# Altium footprint library RES_TH.PcbLib: 104 footprints (part 1 of 7)
Each footprint in its own frame and in the unit in brackets; x right, y up, seen from the top. Pads: shape width x height; smd on the part's side, far side on the other; paste and mask are expansions set on the pad; w line width, h text height; cw(c..) or ccw(c..) is an arc to the next point about the centre after c.
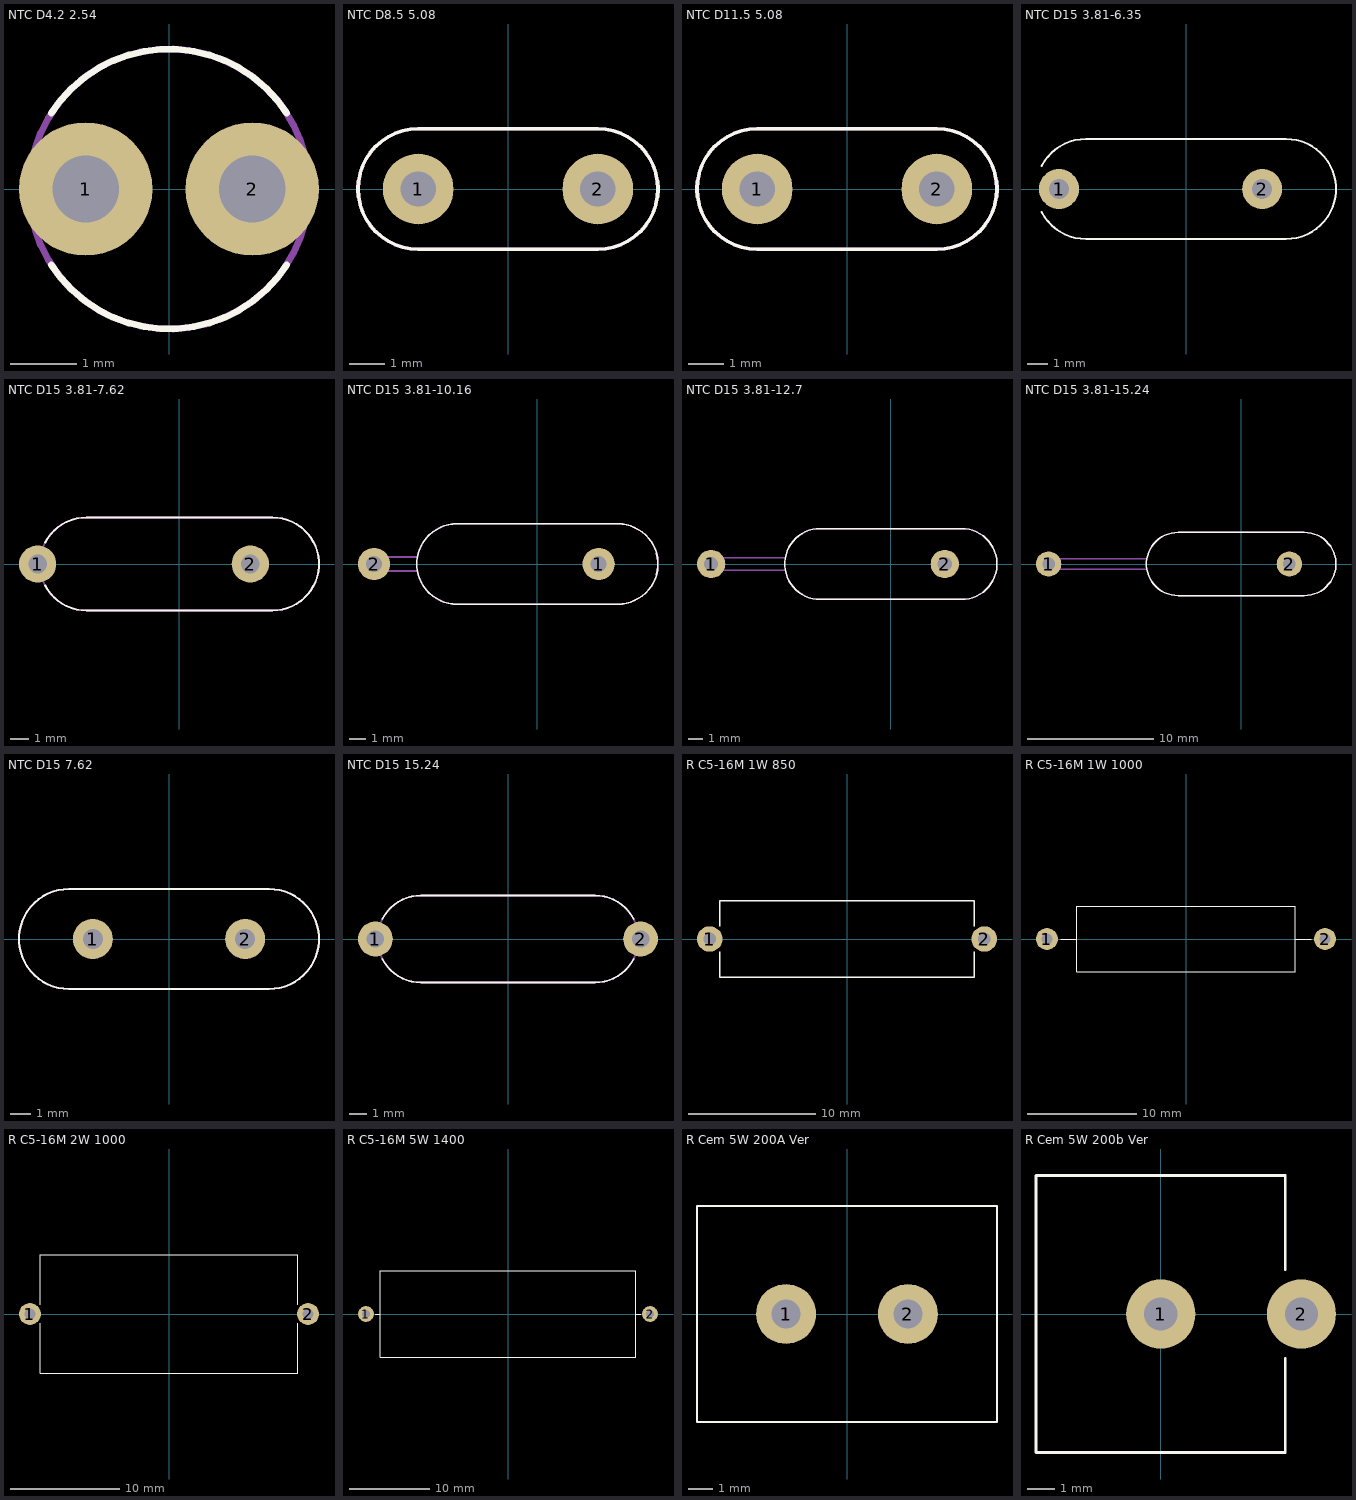
[diagram p0: the footprints below, top view; thin cyan lines are the x and y axes]

## NTC D4.2 2.54 [mm]
pads (2):
  round 2 hole 1: 1(-1.25,0) 2(1.25,0)
Top Overlay:
  lines w0.1: -1.767,-1.136 ccw(c0,0) 1.766,-1.136 ; -1.766,1.136 cw(c0,0) 1.767,1.136
Top Courtyard:
  circle w0.1: c0,0 r2.1
3D body "NTC 2.STEP": height 7.99, standoff -3, extent -2.1,-2 2.096,2

## NTC D8.5 5.08 [mm]
pads (2):
  round 2 hole 1: 1(-2.54,0) 2(2.54,0)
Top Overlay:
  lines w0.1: -2.54,-1.7 cw(c-2.54,0) -2.54,1.7 2.54,1.7 cw(c2.54,0) 2.54,-1.7 -2.54,-1.7
Top Courtyard:
  lines w0.1: -2.54,-1.7 cw(c-2.54,0) -2.54,1.7 2.54,1.7 cw(c2.54,0) 2.54,-1.7 -2.54,-1.7
3D body "NTC B57153 d8.5 5mm.STEP": height 14.25, standoff 0, extent -4.25,-1.679 4.25,1.68

## NTC D11.5 5.08 [mm]
pads (2):
  round 2 hole 1: 1(-2.54,0) 2(2.54,0)
Top Overlay:
  lines w0.1: -2.54,-1.7 cw(c-2.54,0) -2.54,1.7 2.54,1.7 cw(c2.54,0) 2.54,-1.7 -2.54,-1.7
Top Courtyard:
  lines w0.1: -2.54,-1.7 cw(c-2.54,0) -2.54,1.7 ; -2.54,-1.7 cw(c-2.54,0) -2.54,1.7 ; -2.54,-1.7 2.54,-1.7 ; -2.54,-1.7 2.54,-1.7 ; -2.54,1.7 2.54,1.7 ; -2.54,1.7 2.54,1.7 ; 2.54,-1.7 ccw(c2.54,0) 2.54,1.7 ; 2.54,-1.7 ccw(c2.54,0) 2.54,1.7
3D body "NTC B57153 d8.5 5mm.STEP": height 14.25, standoff 0, extent -4.25,-1.679 4.25,1.68

## NTC D15 3.81-6.35 [mm]
pads (2):
  round 2 hole 1: 1(-6.35,0) 2(3.81,0)
Top Overlay:
  lines w0.1: -7.224,-1.141 ccw(c-5,0) -5,-2.5 ; -7.224,1.141 cw(c-5,0) -5,2.5 5,2.5 cw(c5,0) 5,-2.5 -5,-2.5
3D body "NTC-B57237 3.81-6.STEP": height 22.5, standoff -2.5, extent -7.5,-2.5 7.5,2.5

## NTC D15 3.81-7.62 [mm]
pads (2):
  round 2 hole 1: 1(-7.62,0) 2(3.81,0)
Top Overlay:
  lines w0.1: -7.224,-1.141 ccw(c-5,0) -5,-2.5 ; -7.224,1.141 cw(c-5,0) -5,2.5 5,2.5 cw(c5,0) 5,-2.5 -5,-2.5
Top Courtyard:
  lines w0.1: -5,-2.5 cw(c-5,0) -5,2.5 5,2.5 cw(c5,0) 5,-2.5 -5,-2.5
3D body "NTC-B57237 3.81-7.STEP": height 22.5, standoff -2.5, extent -8.02,-2.5 7.5,2.5

## NTC D15 3.81-10.16 [mm]
pads (2):
  round 2 hole 1: 1(3.81,0) 2(-10.16,0)
Top Overlay:
  lines w0.1: -5,-2.5 cw(c-5,0) -5,2.5 5,2.5 cw(c5,0) 5,-2.5 -5,-2.5
Top Courtyard:
  lines w0.1: -10.125,-0.434 -10.125,0.434 -7.462,0.434 cw(c-5,0) -5,2.5 5,2.5 cw(c5,0) 5,-2.5 -5,-2.5 cw(c-5,0) -7.462,-0.434 -10.125,-0.434
3D body "NTC-B57237 3.81-10.STEP": height 22.5, standoff -2.5, extent -10.56,-2.5 7.5,2.5

## NTC D15 3.81-12.7 [mm]
pads (2):
  round 2 hole 1: 1(-12.7,0) 2(3.81,0)
Top Overlay:
  lines w0.1: -5,-2.5 cw(c-5,0) -5,2.5 5,2.5 cw(c5,0) 5,-2.5 -5,-2.5
Top Courtyard:
  lines w0.1: -12.625,-0.434 -12.625,0.434 -7.462,0.434 cw(c-5,0) -5,2.5 5,2.5 cw(c5,0) 5,-2.5 -5,-2.5 cw(c-5,0) -7.462,-0.434 -12.625,-0.434
3D body "NTC-B57237 3.81-12.STEP": height 22.5, standoff -2.5, extent -13.1,-2.5 7.5,2.5

## NTC D15 3.81-15.24 [mm]
pads (2):
  round 2 hole 1: 1(-15.24,0) 2(3.81,0)
Top Overlay:
  lines w0.1: -5,-2.5 cw(c-5,0) -5,2.5 5,2.5 cw(c5,0) 5,-2.5 -5,-2.5
Top Courtyard:
  lines w0.1: -15.25,-0.434 -15.25,0.434 -7.462,0.434 cw(c-5,0) -5,2.5 5,2.5 cw(c5,0) 5,-2.5 -5,-2.5 cw(c-5,0) -7.462,-0.434 -15.25,-0.434
3D body "NTC-B57237 3.81-15.STEP": height 22.5, standoff -2.5, extent -15.64,-2.5 7.5,2.5

## NTC D15 7.62 [mm]
pads (2):
  round 2 hole 1: 1(-3.81,0) 2(3.81,0)
Top Overlay:
  lines w0.1: -5,-2.5 cw(c-5,0) -5,2.5 5,2.5 cw(c5,0) 5,-2.5 -5,-2.5
Top Courtyard:
  lines w0.1: -5,-2.5 cw(c-5,0) -5,2.5 5,2.5 cw(c5,0) 5,-2.5 -5,-2.5
3D body "NTC-B57237 7.STEP": height 22.5, standoff -2.5, extent -7.5,-2.5 7.5,2.5

## NTC D15 15.24 [mm]
pads (2):
  round 2 hole 1: 1(-7.62,0) 2(7.62,0)
Top Overlay:
  lines w0.1: -7.224,-1.141 ccw(c-5,0) -5,-2.5 5,-2.5 ; -7.224,1.141 cw(c-5,0) -5,2.5 5,2.5 cw(c5,0) 7.224,1.141 ; 5,-2.5 ccw(c5,0) 7.224,-1.141
Top Courtyard:
  lines w0.1: -5,-2.5 cw(c-5,0) -5,2.5 5,2.5 cw(c5,0) 5,-2.5 -5,-2.5
3D body "NTC-B57237 7.62-7.STEP": height 22.5, standoff -2.5, extent -8.02,-2.5 8.079,2.5

## R C5-16M 1W 850 [mm]
pads (2):
  round 2 hole 1: 1(-10.795,0) 2(10.795,0)
Top Overlay:
  lines w0.1: -10,-1.016 -10,-3 10,-3 10,-1.016 ; -10,1.016 -10,3 10,3 10,1.016
3D body "R1W C5-16M 850.SLDPRT": height 6, standoff -2.5, extent -11.291,-3 11.291,3

## R C5-16M 1W 1000 [mm]
pads (2):
  round 2 hole 1: 1(-12.7,0) 2(12.7,0)
Top Overlay:
  lines w0.1: -11.43,0 -10,0 ; 10,0 11.43,0 ; -10,-3 -10,3 10,3 10,-3 -10,-3
3D body "R1W C5-16M 1000.SLDPRT": height 6, standoff -2.5, extent -13.196,-3 13.196,3

## R C5-16M 2W 1000 [mm]
pads (2):
  round 2 hole 1: 1(-12.7,0) 2(12.7,0)
Top Overlay:
  lines w0.1: -12.7,0 -11.75,0 ; -11.75,-0.85 -11.75,-5.4 11.75,-5.4 11.75,-0.85 ; -11.75,0.85 -11.75,5.4 11.75,5.4 11.75,0.85
3D body "R2W C5-16M 1000.SLDPRT": height 10.8, standoff -2.5, extent -13.196,-5.4 13.196,5.4

## R C5-16M 5W 1400 [mm]
pads (2):
  round 2 hole 1: 1(-17.78,0) 2(17.78,0)
Top Overlay:
  lines w0.1: -16.6,0 -16,0 ; 16,0 16.6,0 ; -16,-5.4 16,-5.4 16,5.4 -16,5.4 -16,-5.4
3D body "R5W C5-16M 1400.SLDPRT": height 10.8, standoff -2.5, extent -18.276,-5.4 18.276,5.4

## R Cem 5W 200A Ver [mm]
pads (2):
  round 2.5 hole 1.2: 1(-2.54,0) 2(2.54,0)
Top Overlay:
  lines w0.1: -6.25,-4.5 -6.25,4.5 6.25,4.5 6.25,-4.5 -6.25,-4.5
3D body "R5W Cem 200A Ver.SLDPRT": height 25, standoff -5, extent -6.25,-4.5 6.25,4.5

## R Cem 5W 200b Ver [mm]
pads (2):
  round 2.5 hole 1.2: 1(0,0) 2(5.08,0)
Top Overlay:
  lines w0.1: 4.5,-1.6 4.5,-5 -4.51,-5 -4.51,5 4.5,5 4.5,1.6
3D body "R5W Cem 200B Ver.SLDPRT": height 24.94, standoff -2.5, extent -4.51,-5 5.48,5